# Altium footprint library IND_SMD.PcbLib: 118 footprints (part 2 of 8)
Each footprint in its own frame and in the unit in brackets; x right, y up, seen from the top. Pads: shape width x height; smd on the part's side, far side on the other; paste and mask are expansions set on the pad; w line width, h text height; cw(c..) or ccw(c..) is an arc to the next point about the centre after c.
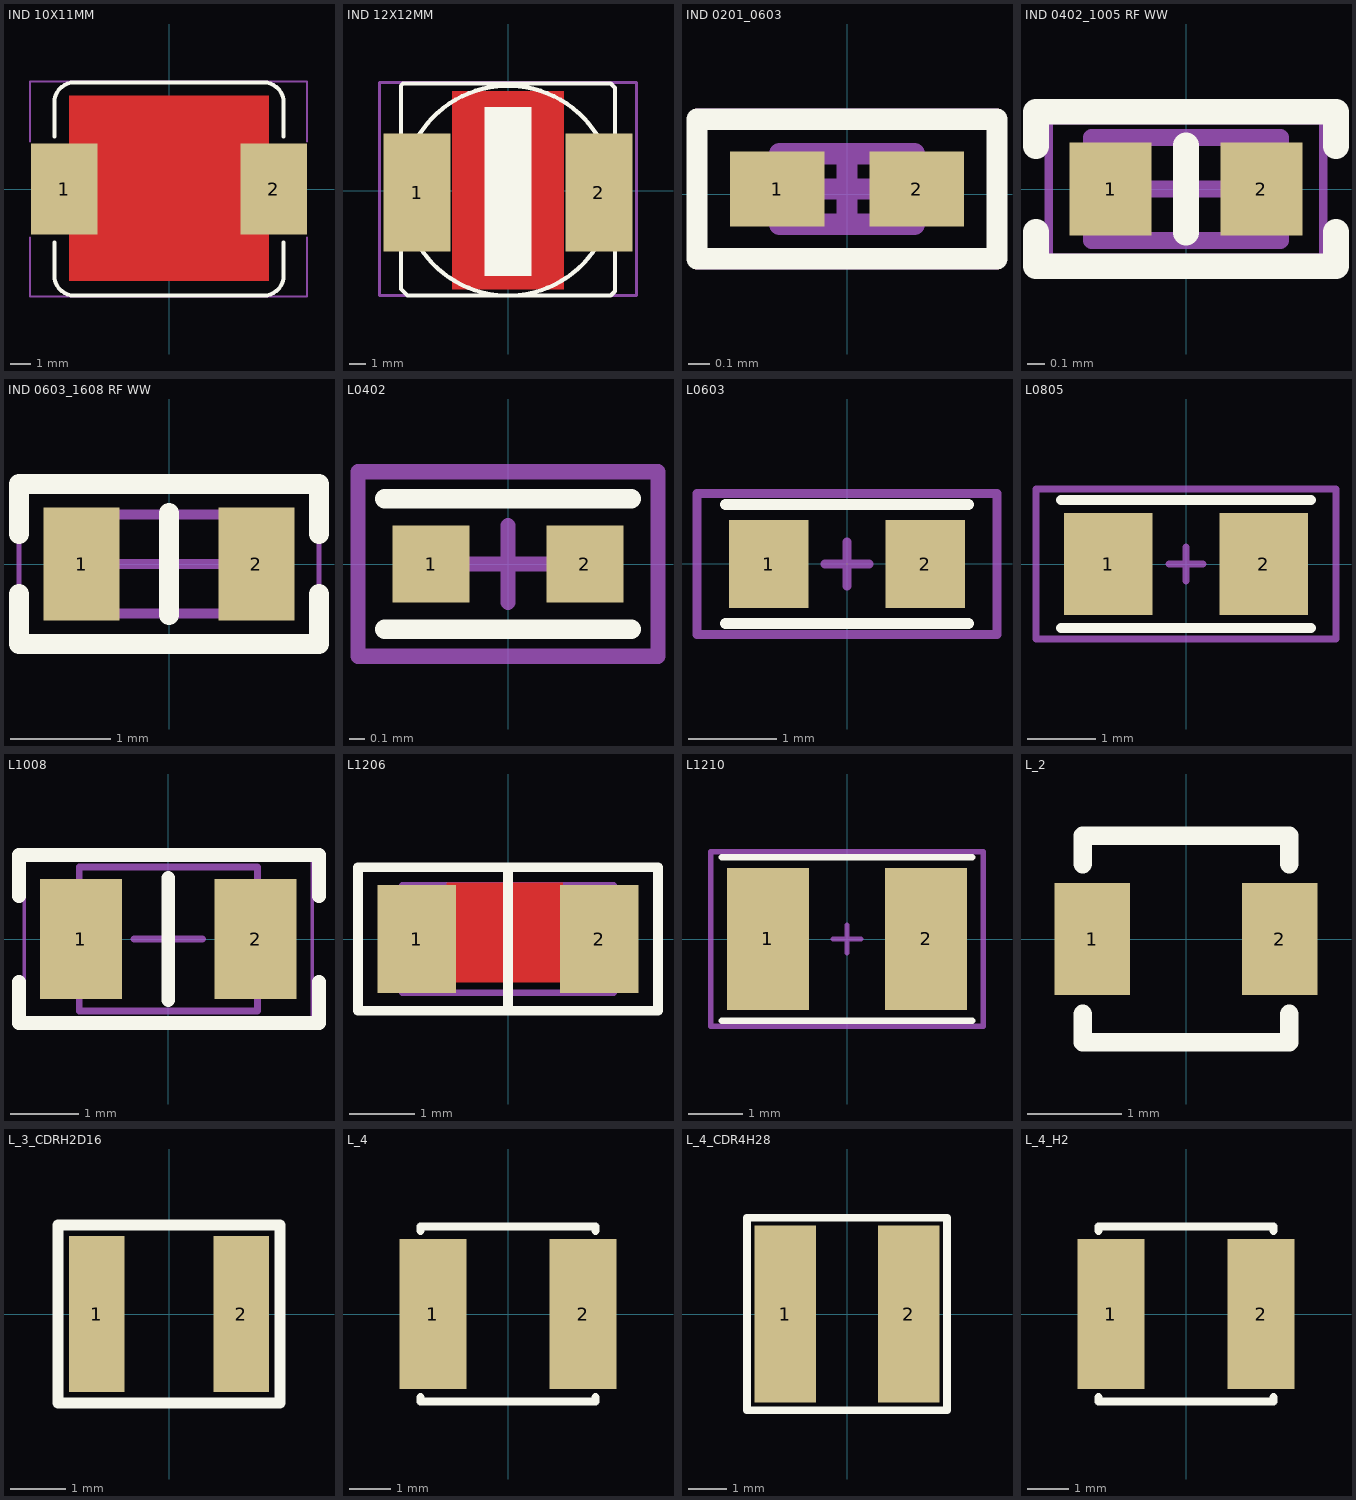
[diagram p1: the footprints below, top view; thin cyan lines are the x and y axes]

## IND 10X11MM [mm]
height 4
pads (2):
  rect 3.3x4.5 smd: 1(-5.207,0) 2(5.207,0)
Top Layer:
  pour cut-out: -4.953,4.635 4.953,4.635 4.953,-4.572 -4.953,-4.572
Top Overlay:
  lines w0.2: -5.7,-2.667 -5.7,-4.3 ccw(c-4.7,-4.3) -4.7,-5.3 4.7,-5.3 ccw(c4.7,-4.3) 5.7,-4.3 5.7,-2.667 ; -5.7,2.603 -5.7,4.3 cw(c-4.7,4.3) -4.7,5.3 4.7,5.3 cw(c4.7,4.3) 5.7,4.3 5.7,2.603
Mechanical 14:
  lines w0.1: -6.921,-2.413 -6.921,-5.334 6.858,-5.334 6.858,-2.413 ; -6.921,2.349 -6.921,5.334 6.858,5.334 6.858,2.349
3D body "MPC1040LR45C.step": height 4.01, standoff 0, extent -5.75,-5.15 5.75,5.15

## IND 12X12MM [mm]
pads (2):
  rect 4x7 smd: 1(-5.397,-0.127) 2(5.397,-0.127)
Top Layer:
  pour cut-out: -3.302,5.905 3.302,5.905 3.302,-5.842 -3.302,-5.842
Top Overlay:
  circle w0.254: c0,0 r6.224
  rectangle: -1.397,-5.08 1.397,4.953
  lines w0.25: -6.35,-5.842 -5.969,-6.223 6.096,-6.223 6.35,-5.969 6.35,6.096 6.096,6.35 -6.223,6.35 -6.35,6.223 -6.35,0.127 -6.35,-5.842
Mechanical 14:
  lines w0.2: 0,6.413 7.62,6.413 ; 7.62,6.413 -7.62,6.413 -7.62,-6.223 7.62,-6.223 7.62,6.413
3D body "User Library-D128C.step": height 8.16, standoff 0, extent -6.179,-6.069 6.137,6.231

## IND 0201_0603 [mm] "Inductor, 2-Leads, Body 0.60x0.30mm, IPC Medium Density"
height 0.33
pads (2):
  rect 0.44x0.35 smd: 1(-0.325,0.025) 2(0.325,0.025)
Top Overlay:
  lines w0.1: -0.7,0.15 -0.7,0.35 0.7,0.35 0.7,0.15 ; -0.7,0.2 -0.7,-0.3 0.7,-0.3 0.7,0.2
Mechanical 13:
  lines w0.1: -0.315,-0.14 -0.315,0.19 0.315,0.19 0.315,-0.14 -0.315,-0.14
Mechanical 15:
  lines w0.05: -0.7,-0.325 -0.7,0.375 0.7,0.375 0.7,-0.325 -0.7,-0.325
  lines w0.1: -0.165,0.025 0.165,0.025 ; 0,-0.14 0,0.19
3D body "INDUC 0201.step": height 0.3, standoff 0, extent -0.3,-0.126 0.3,0.174

## IND 0402_1005 RF WW [mm] "Chip Inductor, 2-Leads, Body 1.00x0.50mm, IPC High Density"
height 0.6
pads (2):
  rect 0.48x0.54 smd: 1(-0.44,0) 2(0.44,0)
Top Overlay:
  lines w0.15: -0.875,-0.25 -0.875,-0.45 0.875,-0.45 0.875,-0.25 ; -0.875,0.25 -0.875,0.45 0.875,0.45 0.875,0.25 ; 0,-0.254 0,0.254
Mechanical 13:
  lines w0.1: -0.55,-0.3 0.55,-0.3 0.55,0.3 -0.55,0.3 -0.55,-0.3
Mechanical 15:
  lines w0.05: -0.8,-0.4 0.8,-0.4 0.8,0.4 -0.8,0.4 -0.8,-0.4
  lines w0.1: -0.3,0 0.3,0 ; 0,-0.3 0,0.3
3D body "IND-WireWound_TOP.STEP": height 0.51, standoff 0.26, extent -0.5,-0.287 0.5,0.287
3D body "IND-WireWound.STEP": height 0.5, standoff 0, extent -0.5,-0.276 0.5,0.277

## IND 0603_1608 RF WW [mm] "Chip Inductor, 2-Leads, Body 1.65x0.99mm, IPC Medium Density"
height 1
pads (2):
  rect 0.76x1.13 smd: 1(-0.875,0) 2(0.875,0)
Top Overlay:
  lines w0.2: -1.5,-0.3 -1.5,-0.8 1.5,-0.8 1.5,-0.3 ; -1.5,0.3 -1.5,0.8 1.5,0.8 1.5,0.3 ; 0,-0.508 0,0.508
Mechanical 13:
  lines w0.1: -0.825,-0.495 0.825,-0.495 0.825,0.495 -0.825,0.495 -0.825,-0.495
Mechanical 15:
  lines w0.05: -1.5,-0.85 1.5,-0.85 1.5,0.85 -1.5,0.85 -1.5,-0.85
  lines w0.1: -0.495,0 0.495,0 ; 0,-0.495 0,0.495
3D body "INDUC - 0603_1608 v4.1.step": height 1, standoff 0.67, extent -0.835,-0.58 0.835,0.58
3D body "INDUC - 0603_1608 v4.step": height 0.79, standoff 0, extent -0.835,-0.536 0.835,0.55

## L0402 [mm]
height 0.6
pads (2):
  rect 0.5x0.5 smd: 1(-0.5,0) 2(0.5,0)
Top Overlay:
  lines w0.127: -0.8,-0.425 0.8,-0.425 ; -0.8,0.425 0.8,0.425
Mechanical 15:
  lines w0.1: -0.25,0 0.25,0 ; 0,-0.25 0,0.25 ; -0.975,-0.6 0.975,-0.6 0.975,0.6 -0.975,0.6 -0.975,-0.6
3D body "User Library-Chip Inductor.step": height 0.6, standoff 0, extent -0.5,-0.25 0.5,0.25

## L0603 [mm]
pads (2):
  rect 0.9x1 smd: 1(-0.889,0) 2(0.889,0)
Top Overlay:
  lines w0.127: -1.375,-0.675 1.375,-0.675 ; -1.375,0.675 1.375,0.675
Mechanical 15:
  lines w0.1: -0.25,0 0.25,0 ; 0,-0.25 0,0.25 ; -1.7,-0.8 1.7,-0.8 1.7,0.8 -1.7,0.8 -1.7,-0.8
3D body "User Library-Chip Inductor (1).step": height 0.95, standoff 0, extent -0.8,-0.4 0.8,0.4

## L0805 [mm]
pads (2):
  rect 1.3x1.5 smd: 1(-1.143,0) 2(1.143,0)
Top Overlay:
  lines w0.15: -1.829,-0.94 1.829,-0.94 ; -1.829,0.94 1.829,0.94
Mechanical 15:
  lines w0.1: -0.25,0 0.25,0 ; 0,-0.25 0,0.25 ; -2.2,-1.1 -2.2,1.1 2.2,1.1 2.2,-1.1 -2.2,-1.1
3D body "User Library-Chip Inductor (2).step": height 0.95, standoff 0, extent -1,-0.6 1,0.6

## L1008 [mm] "Chip Inductance, 2-leads, Body 2.5x2.1mm, IPC Medium Density"
height 0.9
pads (2):
  rect 1.2x1.75 smd: 1(-1.275,0) 2(1.275,0)
Top Overlay:
  lines w0.2: -2.178,-0.625 -2.178,-1.225 2.2,-1.225 2.2,-0.625 ; -2.178,0.625 -2.178,1.225 2.2,1.225 2.2,0.625 ; 0,-0.889 0,0.889
Mechanical 13:
  lines w0.1: -1.3,-1.05 1.3,-1.05 1.3,1.05 -1.3,1.05 -1.3,-1.05
Mechanical 15:
  lines w0.05: -2.1,-1.2 -2.1,1.2 2.1,1.2 2.1,-1.2 -2.1,-1.2
  lines w0.1: -0.5,0 0.5,0 ; 0,-0.5 0,0.5
3D body "INDUC 1008.step": height 1, standoff 0, extent -1.3,-1.05 1.3,1.05

## L1206 [mm]
height 0.9
pads (2):
  rect 1.2x1.65 smd: 1(-1.4,0) 2(1.4,0)
Top Layer:
  pour cut-out: -0.939,0.86 -0.939,-0.664 0.839,-0.664 0.839,0.86
Top Overlay:
  lines w0.15: -2.3,-0.8 -2.3,-1.1 2.3,-1.1 2.3,0.86 ; -2.3,-0.78 -2.3,1.1 2.3,1.1 2.3,0.8 ; 0,-1.1 0,1.1
Mechanical 13:
  lines w0.1: -1.625,-0.825 -1.625,0.825 1.625,0.825 1.625,-0.825 -1.625,-0.825
Mechanical 15:
  lines w0.05: -2.25,-1.1 -2.25,1.1 2.25,1.1 2.25,-1.1 -2.25,-1.1
  lines w0.1: -0.5,0 0.5,0 ; 0,-0.5 0,0.5
3D body "INDC3216X130N EIA 1206.step": height 1.4, standoff 0.1, extent -1.6,-0.8 1.6,0.8

## L1210 [mm]
pads (2):
  rect 1.5x2.6 smd: 1(-1.45,0) 2(1.45,0)
Top Overlay:
  lines w0.12: -2.3,-1.5 2.3,-1.5 ; -2.3,1.5 2.3,1.5
Mechanical 15:
  lines w0.1: -0.25,0 0.25,0 ; 0,-0.25 0,0.25 ; -2.5,-1.6 2.5,-1.6 2.5,1.6 -2.5,1.6 -2.5,-1.6
3D body "User Library-Chip Inductor.step": height 1.35, standoff 0, extent -1.6,-1.25 1.6,1.25

## L_2 [mm] "INDUCTOR, 2.0X2.0mm"
pads (2):
  rect 0.8x1.2 smd paste-0.1: 1(-1,0) 2(1,0)
Top Overlay:
  lines w0.2: -1.1,-0.8 -1.1,-1.1 1.1,-1.1 1.1,-0.8 ; -1.1,0.8 -1.1,1.1 1.1,1.1 1.1,0.8
3D body: height 2, standoff 0, extent -1,-1 1,1

## L_3_CDRH2D16 [mm] "INDUCTOR, 3.0X3.2mm, CDRH2D16"
height 1.6
pads (2):
  rect 1x2.8 smd paste-0.2 mask+0.1: 1(-1.3,0) 2(1.3,0)
Top Overlay:
  lines w0.2: -2,-1.6 -2,1.6 2,1.6 2,-1.6 -2,-1.6
3D body: height 1.2, standoff 0, extent -1.5,-1.5 1.5,1.5

## L_4 [mm] "INDUCTOR, 3.8x3.8mm, 3.7x3.5mm, WURTH 744031470"
height 1.7
pads (2):
  rect 1.6x3.6 smd paste-0.2: 1(-1.8,0) 2(1.8,0)
Top Overlay:
  lines w0.2: -2.1,-2 -2.1,-2.1 2.1,-2.1 2.1,-2 ; -2.1,2 -2.1,2.1 2.1,2.1 2.1,2
3D body: height 1.7, standoff 0, extent -2,-2 2,2

## L_4_CDR4H28 [mm] "INDUCTOR, 4X4X2.8mm, CDR4H28"
height 2.8
pads (2):
  rect 1.6x4.6 smd paste-0.2: 1(-1.6,0) 2(1.6,0)
Top Overlay:
  lines w0.2: -2.6,-2.5 -2.6,2.5 2.6,2.5 2.6,-2.5 -2.6,-2.5
3D body "User Library-CDRH4D28.step": height 2.91, standoff 0, extent -2.45,-2.45 2.45,2.45

## L_4_H2 [mm] "INDUCTOR, 4.1X4.1X2.1mm, VLCF4020"
height 2.1
pads (2):
  rect 1.6x3.6 smd paste-0.2: 1(-1.8,0) 2(1.8,0)
Top Overlay:
  lines w0.2: -2.1,-2 -2.1,-2.1 2.1,-2.1 2.1,-2 ; -2.1,2 -2.1,2.1 2.1,2.1 2.1,2
3D body "User Library-VLCF4020.step": height 2, standoff 0, extent -2.05,-2 2.05,2